# Altium footprint library 400236.PcbLib: 109 footprints (part 6 of 7)
Each footprint in its own frame and in the unit in brackets; x right, y up, seen from the top. Pads: shape width x height; smd on the part's side, far side on the other; paste and mask are expansions set on the pad; w line width, h text height; cw(c..) or ccw(c..) is an arc to the next point about the centre after c.
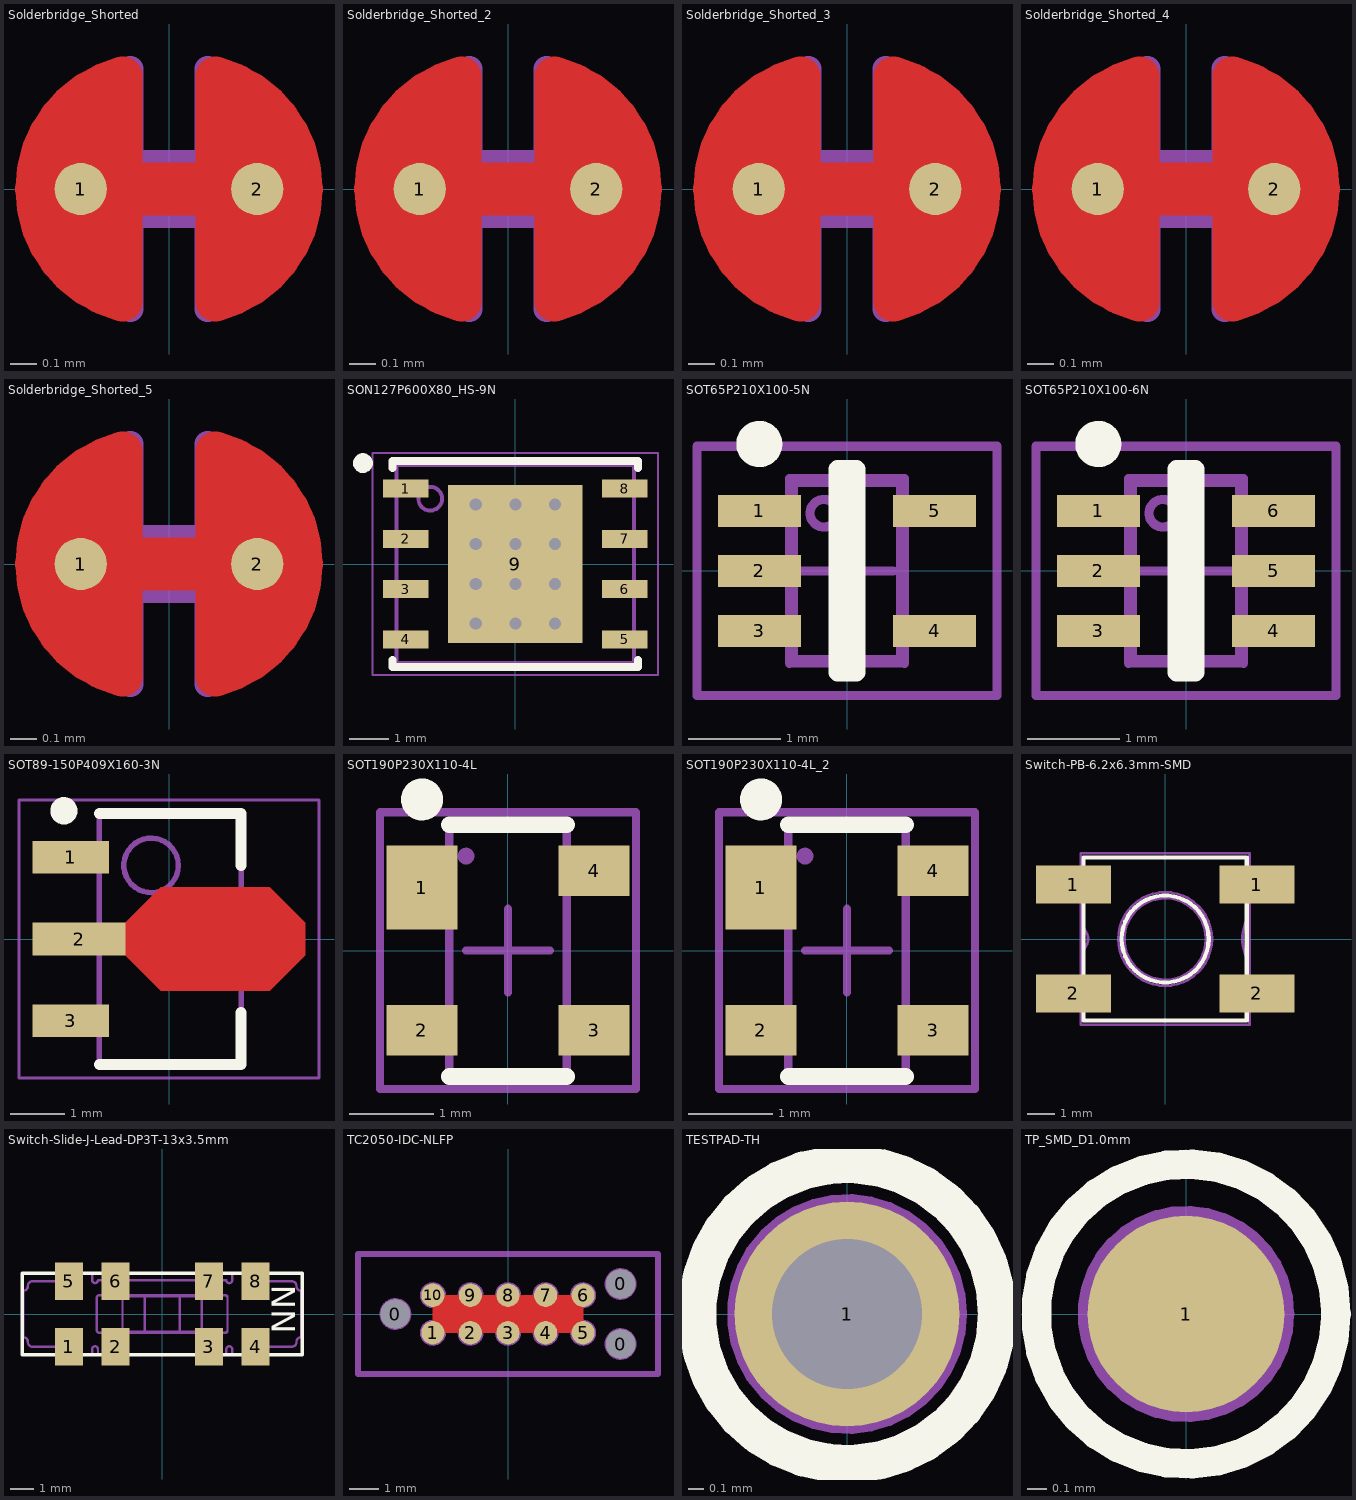
[diagram p5: the footprints below, top view; thin cyan lines are the x and y axes]

## Solderbridge_Shorted [mm]
pads (2):
  round 0.2 smd paste-10: 1(-0.338,0) 2(0.338,0)
Top Layer:
  region: -0.102,-0.432 -0.178,-0.505 -0.296,-0.467 -0.361,-0.424 -0.434,-0.351 -0.488,-0.292 -0.546,-0.193 -0.574,-0.099 -0.569,0.122 -0.544,0.193 -0.46,0.33 -0.376,0.411 -0.284,0.469 -0.183,0.5 -0.132,0.483 -0.102,0.43
  region: 0.102,0.432 0.178,0.505 0.296,0.467 0.361,0.424 0.434,0.351 0.488,0.292 0.546,0.193 0.574,0.099 0.569,-0.122 0.544,-0.193 0.46,-0.33 0.376,-0.411 0.284,-0.469 0.183,-0.5 0.132,-0.483 0.102,-0.43
  lines w0.152: -0.178,-0.431 cw(c-0.068,0) -0.178,0.431 ; 0.178,-0.431 ccw(c0.068,0) 0.178,0.431
  lines w0.203: -0.338,0 0.338,0
Top Solder:
  circle w0.61: c0.028,0 r0.279
  circle w0.61: c-0.028,0 r0.279
Mechanical 7:
  lines w0.1: -0.148,-0.459 cw(c-0.067,0) -0.148,0.459 -0.148,0.1 0.148,0.1 0.148,0.459 cw(c0.067,0) 0.148,-0.459 0.148,-0.1 -0.148,-0.1 -0.148,-0.459
  text ".Designator" at 0.635,-0.152 h0.3

## Solderbridge_Shorted_2 [mm]
pads (2):
  round 0.2 smd paste-10: 1(-0.338,0) 2(0.338,0)
Top Layer:
  region: -0.102,-0.432 -0.178,-0.505 -0.296,-0.467 -0.361,-0.424 -0.434,-0.351 -0.488,-0.292 -0.546,-0.193 -0.574,-0.099 -0.569,0.122 -0.544,0.193 -0.46,0.33 -0.376,0.411 -0.284,0.469 -0.183,0.5 -0.132,0.483 -0.102,0.43
  region: 0.102,0.432 0.178,0.505 0.296,0.467 0.361,0.424 0.434,0.351 0.488,0.292 0.546,0.193 0.574,0.099 0.569,-0.122 0.544,-0.193 0.46,-0.33 0.376,-0.411 0.284,-0.469 0.183,-0.5 0.132,-0.483 0.102,-0.43
  lines w0.152: -0.178,-0.431 cw(c-0.068,0) -0.178,0.431 ; 0.178,-0.431 ccw(c0.068,0) 0.178,0.431
  lines w0.203: -0.338,0 0.338,0
Top Solder:
  circle w0.61: c0.028,0 r0.279
  circle w0.61: c-0.028,0 r0.279
Mechanical 7:
  lines w0.1: -0.148,-0.459 cw(c-0.067,0) -0.148,0.459 -0.148,0.1 0.148,0.1 0.148,0.459 cw(c0.067,0) 0.148,-0.459 0.148,-0.1 -0.148,-0.1 -0.148,-0.459
  text ".Designator" at 0.559,-0.559 h0.3

## Solderbridge_Shorted_3 [mm]
pads (2):
  round 0.2 smd paste-10: 1(-0.338,0) 2(0.338,0)
Top Layer:
  region: -0.102,-0.432 -0.178,-0.505 -0.296,-0.467 -0.361,-0.424 -0.434,-0.351 -0.488,-0.292 -0.546,-0.193 -0.574,-0.099 -0.569,0.122 -0.544,0.193 -0.46,0.33 -0.376,0.411 -0.284,0.469 -0.183,0.5 -0.132,0.483 -0.102,0.43
  region: 0.102,0.432 0.178,0.505 0.296,0.467 0.361,0.424 0.434,0.351 0.488,0.292 0.546,0.193 0.574,0.099 0.569,-0.122 0.544,-0.193 0.46,-0.33 0.376,-0.411 0.284,-0.469 0.183,-0.5 0.132,-0.483 0.102,-0.43
  lines w0.152: -0.178,-0.431 cw(c-0.068,0) -0.178,0.431 ; 0.178,-0.431 ccw(c0.068,0) 0.178,0.431
  lines w0.203: -0.338,0 0.338,0
Top Solder:
  circle w0.61: c0.028,0 r0.279
  circle w0.61: c-0.028,0 r0.279
Mechanical 7:
  lines w0.1: -0.148,-0.459 cw(c-0.067,0) -0.148,0.459 -0.148,0.1 0.148,0.1 0.148,0.459 cw(c0.067,0) 0.148,-0.459 0.148,-0.1 -0.148,-0.1 -0.148,-0.459
  text ".Designator" at 0.381,-0.559 h0.3

## Solderbridge_Shorted_4 [mm]
pads (2):
  round 0.2 smd paste-10: 1(-0.338,0) 2(0.338,0)
Top Layer:
  region: -0.102,-0.432 -0.178,-0.505 -0.296,-0.467 -0.361,-0.424 -0.434,-0.351 -0.488,-0.292 -0.546,-0.193 -0.574,-0.099 -0.569,0.122 -0.544,0.193 -0.46,0.33 -0.376,0.411 -0.284,0.469 -0.183,0.5 -0.132,0.483 -0.102,0.43
  region: 0.102,0.432 0.178,0.505 0.296,0.467 0.361,0.424 0.434,0.351 0.488,0.292 0.546,0.193 0.574,0.099 0.569,-0.122 0.544,-0.193 0.46,-0.33 0.376,-0.411 0.284,-0.469 0.183,-0.5 0.132,-0.483 0.102,-0.43
  lines w0.152: -0.178,-0.431 cw(c-0.068,0) -0.512,0 cw(c-0.068,0) -0.178,0.431 ; 0.178,-0.431 ccw(c0.068,0) 0.178,0.431
  lines w0.203: -0.338,0 0.338,0
Top Solder:
  circle w0.61: c0.028,0 r0.279
  circle w0.61: c-0.028,0 r0.279
Mechanical 7:
  lines w0.1: -0.148,-0.459 cw(c-0.067,0) -0.148,0.459 -0.148,0.1 0.148,0.1 0.148,0.459 cw(c0.067,0) 0.148,-0.459 0.148,-0.1 -0.148,-0.1 -0.148,-0.459
  text ".Designator" at -0.635,0.635 h0.38

## Solderbridge_Shorted_5 [mm]
pads (2):
  round 0.2 smd paste-10: 1(-0.338,0) 2(0.338,0)
Top Layer:
  region: 0.102,0.432 0.178,0.505 0.296,0.467 0.361,0.424 0.434,0.351 0.488,0.292 0.546,0.193 0.574,0.099 0.569,-0.122 0.544,-0.193 0.46,-0.33 0.376,-0.411 0.284,-0.469 0.183,-0.5 0.132,-0.483 0.102,-0.43
  region: -0.102,-0.432 -0.178,-0.505 -0.296,-0.467 -0.361,-0.424 -0.434,-0.351 -0.488,-0.292 -0.546,-0.193 -0.574,-0.099 -0.569,0.122 -0.544,0.193 -0.46,0.33 -0.376,0.411 -0.284,0.469 -0.183,0.5 -0.132,0.483 -0.102,0.43
  lines w0.152: -0.178,-0.431 cw(c-0.068,0) -0.178,0.431 ; 0.178,-0.431 ccw(c0.068,0) 0.178,0.431
  lines w0.203: -0.338,0 0.338,0
Top Solder:
  circle w0.61: c-0.028,0 r0.279
  circle w0.61: c0.028,0 r0.279
Mechanical 7:
  lines w0.1: -0.148,-0.459 cw(c-0.067,0) -0.148,0.459 -0.148,0.1 0.148,0.1 0.148,0.459 cw(c0.067,0) 0.148,-0.459 0.148,-0.1 -0.148,-0.1 -0.148,-0.459
  text ".Designator" at -0.584,-0.889 h0.3

## SON127P600X80_HS-9N [mm]
pads (9):
  rect 1.15x0.45 smd: 1(-2.77,1.905) 2(-2.77,0.635) 3(-2.77,-0.635) 4(-2.77,-1.905) 5(2.77,-1.905) 6(2.77,-0.635) 7(2.77,0.635) 8(2.77,1.905)
  rect 3.4x4 smd paste-1.7: 9(0,0)
via -1,1.5 diameter 0.61 hole 0.305
via 0,1.5 diameter 0.61 hole 0.305
via 1,1.5 diameter 0.61 hole 0.305
via -1,0.5 diameter 0.61 hole 0.305
via 0,0.5 diameter 0.61 hole 0.305
via 1,0.5 diameter 0.61 hole 0.305
via -1,-0.5 diameter 0.61 hole 0.305
via 0,-0.5 diameter 0.61 hole 0.305
via 1,-0.5 diameter 0.61 hole 0.305
via -1,-1.5 diameter 0.61 hole 0.305
via 0,-1.5 diameter 0.61 hole 0.305
via 1,-1.5 diameter 0.61 hole 0.305
Top Overlay:
  circle w0.25: c-3.85,2.55 r0.125
  lines w0.2: -3.1,-2.43 -3.1,-2.6 3.1,-2.6 3.1,-2.43 ; -3.1,2.43 -3.1,2.6 3.1,2.6 3.1,2.43
Top Paste:
  rectangle: -1.595,0.765 -0.665,1.895
  rectangle: -1.595,-0.565 -0.665,0.565
  rectangle: -1.595,-1.895 -0.665,-0.765
  rectangle: -0.465,0.765 0.465,1.895
  rectangle: -0.465,-0.565 0.465,0.565
  rectangle: -0.465,-1.895 0.465,-0.765
  rectangle: 0.665,0.765 1.595,1.895
  rectangle: 0.665,-0.565 1.595,0.565
  rectangle: 0.665,-1.895 1.595,-0.765
Mechanical 7:
  circle w0.1: c-2.15,1.65 r0.3
  lines w0.1: -3,-2.5 -3,2.5 3,2.5 3,-2.5 -3,-2.5
  text ".Designator" at 0.262,0.13 h0.3
Mechanical 15:
  lines w0.05: -3.605,-2.8 -3.605,2.8 3.605,2.8 3.605,-2.8 -3.605,-2.8
  lines w0.1: -0.5,0 0.5,0 ; 0,-0.5 0,0.5
3D body "SON127P600X80_HS-9N.step": height 0.8, standoff 0, extent -3.051,-2.55 3.051,2.55

## SOT65P210X100-5N [mm]
pads (5):
  rect 0.9x0.35 smd: 1(-0.95,0.65) 2(-0.95,0) 3(-0.95,-0.65) 4(0.95,-0.65) 5(0.95,0.65)
Top Overlay:
  circle w0.25: c-0.95,1.375 r0.125
  lines w0.2: -0.1,-1.1 0.1,-1.1 0.1,1.1 -0.1,1.1 -0.1,-1.1
Mechanical 7:
  circle w0.1: c-0.25,0.625 r0.15
  lines w0.1: -1.048,-0.748 -1.048,-0.545 ; -1.048,-0.101 -1.048,0.103 ; -1.048,0.547 -1.048,0.75 ; -0.862,-0.76 -0.862,-0.532 ; -0.862,-0.113 -0.862,0.115 ; -0.862,0.534 -0.862,0.762 ; -0.624,-0.999 -0.624,-0.998 ; -0.624,-0.76 -0.624,-0.998 ; -0.624,-0.532 -0.624,-0.113 ; -0.624,0.115 -0.624,0.534 ; -0.624,0.762 -0.624,1 0.624,1 0.624,0.762 ; 0.624,-0.999 0.624,-0.998 ; 0.624,-0.76 0.624,-0.998 ; 0.624,-0.532 0.624,0.534 ; 0.862,-0.76 0.862,-0.532 ; 0.862,0.534 0.862,0.762 ; 1.048,-0.748 1.048,-0.545 ; 1.048,0.547 1.048,0.75 ; -0.624,-0.998 0.624,-0.998 ; -1.048,-0.76 -1.048,-0.532 -0.611,-0.532 -0.611,-0.76 -1.048,-0.76 ; -1.048,-0.113 -0.611,-0.113 -0.611,0.115 -1.048,0.115 -1.048,-0.113 ; -1.048,0.534 -1.048,0.762 -0.611,0.762 -0.611,0.534 -1.048,0.534 ; -0.582,-0.96 0.582,-0.96 0.582,0.961 -0.582,0.961 -0.582,-0.96 ; 0.611,-0.76 1.048,-0.76 1.048,-0.532 0.611,-0.532 0.611,-0.76 ; 0.611,0.534 1.048,0.534 1.048,0.762 0.611,0.762 0.611,0.534
Mechanical 15:
  lines w0.1: -0.5,0 0.5,0 ; 0,-0.5 0,0.5 ; -1.625,-1.35 -1.625,1.35 1.625,1.35 1.625,-1.35 -1.625,-1.35
3D body "User Library-SC70-5.STEP": height 0.97, standoff 0, extent -1.1,-1 1.1,1

## SOT65P210X100-6N [mm]
pads (6):
  rect 0.9x0.35 smd: 1(-0.95,0.65) 2(-0.95,0) 3(-0.95,-0.65) 4(0.95,-0.65) 5(0.95,0) 6(0.95,0.65)
Top Overlay:
  circle w0.25: c-0.95,1.375 r0.125
  lines w0.2: -0.1,-1.1 0.1,-1.1 0.1,1.1 -0.1,1.1 -0.1,-1.1
Mechanical 7:
  circle w0.1: c-0.25,0.625 r0.15
  lines w0.1: -1.048,-0.748 -1.048,-0.545 ; -1.048,-0.101 -1.048,0.103 ; -1.048,0.547 -1.048,0.75 ; -0.862,-0.76 -0.862,-0.532 ; -0.862,-0.113 -0.862,0.115 ; -0.862,0.534 -0.862,0.762 ; -0.624,-0.999 -0.624,-0.998 ; -0.624,-0.76 -0.624,-0.998 ; -0.624,-0.532 -0.624,-0.113 ; -0.624,0.115 -0.624,0.534 ; -0.624,0.762 -0.624,1 0.624,1 0.624,0.762 ; 0.624,-0.999 0.624,-0.998 ; 0.624,-0.76 0.624,-0.998 ; 0.624,-0.532 0.624,-0.113 ; 0.624,0.115 0.624,0.534 ; 0.862,-0.76 0.862,-0.532 ; 0.862,-0.113 0.862,0.115 ; 0.862,0.534 0.862,0.762 ; 1.048,-0.748 1.048,-0.545 ; 1.048,-0.101 1.048,0.103 ; 1.048,0.547 1.048,0.75 ; -0.624,-0.998 0.624,-0.998 ; -1.048,-0.76 -0.611,-0.76 -0.611,-0.532 -1.048,-0.532 -1.048,-0.76 ; -1.048,-0.113 -1.048,0.115 -0.611,0.115 -0.611,-0.113 -1.048,-0.113 ; -1.048,0.534 -0.611,0.534 -0.611,0.762 -1.048,0.762 -1.048,0.534 ; -0.582,-0.96 -0.582,0.961 0.582,0.961 0.582,-0.96 -0.582,-0.96 ; 0.611,-0.76 0.611,-0.532 1.048,-0.532 1.048,-0.76 0.611,-0.76 ; 0.611,-0.113 1.048,-0.113 1.048,0.115 0.611,0.115 0.611,-0.113 ; 0.611,0.534 0.611,0.762 1.048,0.762 1.048,0.534 0.611,0.534
  text ".Designator" at 0.4,-0.55 h0.38
Mechanical 15:
  lines w0.1: -0.5,0 0.5,0 ; 0,-0.5 0,0.5 ; -1.625,-1.35 -1.625,1.35 1.625,1.35 1.625,-1.35 -1.625,-1.35
3D body "SW3dPS-SC70-6.STEP": height 0.92, standoff -0.03, extent -1.05,-1 1.05,1

## SOT89-150P409X160-3N [mm]
pads (3):
  rect 1.4x0.6 smd: 1(-1.8,1.5) 3(-1.8,-1.5)
  rect 1.7x0.6 smd: 2(-1.65,0)
Top Layer:
  region: -0.8,0.3 -0.15,0.95 1.85,0.95 2.5,0.3 2.5,-0.3 1.85,-0.95 -0.15,-0.95 -0.8,-0.3
Top Overlay:
  circle w0.25: c-1.928,2.35 r0.125
  lines w0.2: -1.278,-2.3 1.322,-2.3 1.322,-1.35 ; -1.278,2.3 1.322,2.3 1.322,1.35
Mechanical 7:
  circle w0.1: c-0.327,1.35 r0.5
  lines w0.1: -1.278,-2.3 -1.278,2.3 1.322,2.3 1.322,-2.3 -1.278,-2.3
  text ".Designator" at -0.432,-0.203 h0.3
Mechanical 15:
  lines w0.05: -2.75,-2.55 -2.75,2.55 2.75,2.55 2.75,-2.55 -2.75,-2.55
  lines w0.1: -0.478,0 0.522,0 ; 0.022,-0.5 0.022,0.5
3D body "SOT89-150P409X160-3N.step": height 1.6, standoff 0, extent -2.2,-2.297 1.93,2.297

## SOT190P230X110-4L [mm]
pads (4):
  rect 0.85x1 smd: 1(-1.025,0.75)
  rect 0.85x0.6 smd: 2(-1.025,-0.95) 3(1.025,-0.95) 4(1.025,0.95)
Top Overlay:
  circle w0.25: c-1.025,1.8 r0.125
  lines w0.2: -0.7,-1.5 0.7,-1.5 ; -0.7,1.5 0.7,1.5
Mechanical 7:
  circle w0.1: c-0.5,1.125 r0.05
  lines w0.1: -0.7,-1.5 0.7,-1.5 0.7,1.5 -0.7,1.5 -0.7,-1.5
  text ".Designator" at 0.127,-0.396 h0.3
Mechanical 15:
  lines w0.1: -0.5,0 0.5,0 ; 0,-0.5 0,0.5 ; -1.525,-1.65 1.525,-1.65 1.525,1.65 -1.525,1.65 -1.525,-1.65
3D body "User Library-sot143.step": height 1, standoff 0, extent -1.21,-1.46 1.21,1.46

## SOT190P230X110-4L_2 [mm]
pads (4):
  rect 0.85x1 smd: 1(-1.025,0.75)
  rect 0.85x0.6 smd: 2(-1.025,-0.95) 3(1.025,-0.95) 4(1.025,0.95)
Top Overlay:
  circle w0.25: c-1.025,1.8 r0.125
  lines w0.2: -0.7,-1.5 0.7,-1.5 ; -0.7,1.5 0.7,1.5
Mechanical 7:
  circle w0.1: c-0.5,1.125 r0.05
  lines w0.1: -0.7,-1.5 0.7,-1.5 0.7,1.5 -0.7,1.5 -0.7,-1.5
  text ".Designator" at 0.184,-0.358 h0.3
Mechanical 15:
  lines w0.1: -0.5,0 0.5,0 ; 0,-0.5 0,0.5 ; -1.525,-1.65 1.525,-1.65 1.525,1.65 -1.525,1.65 -1.525,-1.65
3D body "User Library-sot143.step": height 1, standoff 0, extent -1.21,-1.46 1.21,1.46

## Switch-PB-6.2x6.3mm-SMD [mm]
pads (4):
  rect 2.75x1.4 smd: 1(-3.375,2) 1(3.375,2) 2(-3.375,-2) 2(3.375,-2)
Top Overlay:
  circle w0.152: c0,0 r1.601
  lines w0.152: -3,-3 3,-3 3,3 -3,3 -3,-3
Mechanical 7:
  circle w0.1: c0,0 r1.5
  circle w0.1: c0,0 r1.721
  lines w0.1: -3.3,-2.393 -3.3,-1.606 ; -3.3,1.606 -3.3,2.393 ; -3.1,-2.393 -3.6,-2.393 -3.6,-1.606 -3.1,-1.606 ; -3.1,-0.441 ccw(c-3.335,0) -3.1,0.441 ; -3.1,1.606 -3.6,1.606 -3.6,2.393 -3.1,2.393 ; 3.1,-2.393 3.6,-2.393 3.6,-1.606 3.1,-1.606 ; 3.1,-0.91 cw(c4.561,0) 3.1,0.91 ; 3.1,1.606 3.6,1.606 3.6,2.393 3.1,2.393 ; 3.3,-2.393 3.3,-1.606 ; 3.3,1.606 3.3,2.393 ; -3.1,-3.15 3.1,-3.15 3.1,3.15 -3.1,3.15 -3.1,-3.15
  text ".Designator" at -0.475,-0.15 h0.38
3D body "TS604VM1-025BR-R.step": height 2.5, standoff 0, extent -3.6,-3.1 3.6,3.1

## Switch-Slide-J-Lead-DP3T-13x3.5mm [mm]
pads (8):
  rect 1.2x1.6 smd: 1(-4,-1.4) 2(-2,-1.4) 3(2,-1.4) 4(4,-1.4) 5(-4,1.4) 6(-2,1.4) 7(2,1.4) 8(4,1.4)
Top Overlay:
  lines w0.152: -6,-1.75 6,-1.75 6,1.75 -6,1.75 -6,-1.75
  text "NN" at 5.7,-0.85 h1.02
Mechanical 7:
  lines w0.1: -6.002,-1.75 -6.002,-1 -5.952,-1 ; -6.002,1.751 -6.002,1.001 -5.952,1.001 ; -6,-1.75 6,-1.75 6,-1 5.95,-1 ; -6,1.751 6,1.751 6,1.001 5.95,1.001 ; -4.003,1.4 -4.002,1.751 ; -4.003,1.4 cw(c-4.127,1.4) -4.252,1.4 -5.552,1.4 ccw(c-5.552,1.2) -5.752,1.191 cw(c-5.943,1.191) -5.952,1.001 ; -4.002,-1.75 -4.002,-1.6 ccw(c-4.203,-1.601) -4.19,-1.4 -5.552,-1.399 cw(c-5.552,-1.199) -5.752,-1.19 ccw(c-5.943,-1.19) -5.952,-1 ; -3.002,1.45 -3.002,1.751 ; -3.002,-1.75 -3.002,-1.51 cw(c-2.877,-1.51) -2.752,-1.51 -2.752,-1.75 ; -3.002,1.448 ccw(c-2.877,1.448) -2.752,1.448 2.75,1.448 ccw(c2.875,1.448) 2.999,1.448 ; 0.748,-0.75 1.698,-0.75 1.698,0.75 0.748,0.75 ; 2.75,-1.75 2.75,-1.51 cw(c2.875,-1.51) 2.999,-1.51 2.999,-1.75 ; 3,1.45 3,1.751 ; 4,-1.75 4,-1.6 cw(c4.201,-1.601) 4.188,-1.4 5.55,-1.399 ccw(c5.55,-1.199) 5.75,-1.19 cw(c5.94,-1.19) 5.95,-1 ; 4,1.751 4,1.4 ; 4,1.4 ccw(c4.125,1.4) 4.25,1.4 5.55,1.4 cw(c5.55,1.2) 5.75,1.191 ccw(c5.94,1.191) 5.95,1.001 ; -5.952,-1 -5.952,1.001 ; -0.751,-0.75 -1.701,-0.75 -1.701,0.75 -0.751,0.75 ; -0.751,-0.75 0.749,-0.75 0.749,0.75 -0.751,0.75 ; -0.751,-0.75 -0.751,0.75 ; 5.95,-1 5.95,1.001 ; -2.8,-0.7 ccw(c-2.7,-0.7) -2.7,-0.8 2.7,-0.8 ccw(c2.7,-0.7) 2.8,-0.7 2.8,0.7 ccw(c2.7,0.7) 2.7,0.8 -2.7,0.8 ccw(c-2.7,0.7) -2.8,0.7 -2.8,-0.7
  text ".Designator" at -0.447,-0.149 h0.3
3D body "CL-SB-23A-01T.stp": height 5.5, standoff 0, extent -6,-1.8 6,1.7

## TC2050-IDC-NLFP [mil]
pads (13):
  round 39 hole 39 unplated mask+3: 0(-150,0) 0(150,-40) 0(150,40)
  round 31 smd paste-196.85: 1(-100,-25) 2(-50,-25) 3(0,-25) 4(50,-25) 5(100,-25) 6(100,25) 7(50,25) 8(0,25) 9(-50,25) 10(-100,25)
Top Layer:
  pour cut-out: -100,25 -100,-25 100,-25 100,25
Mechanical 7:
  circle w3.94: c-100,24.99 r15.45
  circle w3.94: c-100,-24.99 r15.45
  circle w3.94: c-50,-24.99 r15.45
  circle w3.94: c0,-24.99 r15.45
  circle w3.94: c0,24.99 r15.45
  circle w3.94: c-50,24.99 r15.45
  circle w3.94: c50,24.99 r15.45
  circle w3.94: c50,-24.99 r15.45
  circle w3.94: c100,-24.99 r15.45
  circle w3.94: c100,24.99 r15.45
  circle w3.94: c150,-39.98 r19.26
  circle w3.94: c150,39.98 r19.26
  circle w3.94: c-150,0 r19.26
  text ".Designator" at -10,-70 h15
Mechanical 8:
  circle w3.94: c-150,0 r19.26
  circle w3.94: c150,39.98 r19.26
  circle w3.94: c150,-39.98 r19.26
Mechanical 15:
  lines w7.87: -199.8,-79.92 -199.8,79.92 199.8,79.92 199.8,-79.92 -199.8,-79.92

## TESTPAD-TH [mm]
pads (1):
  round 1.5 hole 1: 1(0,0)
Top Overlay:
  circle w0.254: c0,0 r1
Mechanical 7:
  circle w0.1: c0,0 r1
  circle w0.1: c0,0 r0.75
  circle w0.1: c0,0 r0.5
  text ".Designator" at -0.483,-0.178 h0.3

## TP_SMD_D1.0mm [mm]
pads (1):
  round 1 smd paste-5: 1(0,0)
Top Overlay:
  circle w0.15: c0,0 r0.762
Mechanical 7:
  circle w0.1: c0,0 r0.5
  circle w0.1: c0,0 r0.762
  text ".Designator" at -0.633,0.918 h0.38